# Altium schematic symbol library Regulator_Linear.SchLib: 1452 symbols (part 3 of 10) (continued)
## LD1086DT50TR
designator *  value LD1086DT50TR
ki_keywords: Linear Regulator 1.5A Fixed Output; ki_description: Positive, 1.5A 30V, Linear Regulator, Fixed Output 5V, TO-252; ki_fp_filters: TO?252?2*; Footprint: Package_TO_SOT_SMD:TO-252-2; Supplier: https://www.st.com/resource/en/datasheet/ld1086.pdf
footprint TO-252-2
pins: 1 ADJ/GND (in), 2 OUT (power), 3 IN (power)

## LD1086DTTR
designator *  value LD1086DTTR
ki_keywords: Linear Regulator 1.5A Adjustable; ki_description: Positive, 1.5A 30V, Linear Regulator, Adjustable, TO-252; ki_fp_filters: TO?252?2*; Footprint: Package_TO_SOT_SMD:TO-252-2; Supplier: https://www.st.com/resource/en/datasheet/ld1086.pdf
footprint TO-252-2
pins: 1 ADJ/GND (in), 2 OUT (power), 3 IN (power)

## LD1086PUR
designator *  value LD1086PUR
ki_keywords: Linear Regulator 1.5A Adjustable; ki_description: Positive, 1.5A 30V, Linear Regulator, Adjustable, DFN8; ki_fp_filters: DFN*1EP*4x4mm*P0.8mm*; Footprint: Package_DFN_QFN:DFN-8-1EP_4x4mm_P0.8mm_EP2.3x3.24mm; Supplier: https://www.st.com/resource/en/datasheet/ld1086.pdf
footprint DFN-8-1EP_4x4mm_P0.8mm_EP2.3x3.24mm
pins: 3 ADJ/GND (in), 7 IN (power), 8 IN hidden, 9 OUT (power)

## LD1086V18-DG
designator *  value LD1086V18-DG
ki_keywords: Linear Regulator 1.5A Fixed Output; ki_description: Positive, 1.5A 30V, Linear Regulator, Fixed Output 1.8V, TO-220; ki_fp_filters: TO?220*; Footprint: Package_TO_SOT_THT:TO-220-3_Vertical; Supplier: https://www.st.com/resource/en/datasheet/ld1086.pdf
footprint TO-220-3_Vertical
pins: 1 ADJ/GND (in), 2 OUT (power), 3 IN (power)

## LD1086V33-DG
designator *  value LD1086V33-DG
ki_keywords: Linear Regulator 1.5A Fixed Output; ki_description: Positive, 1.5A 30V, Linear Regulator, Fixed Output 3.3V, TO-220; ki_fp_filters: TO?220*; Footprint: Package_TO_SOT_THT:TO-220-3_Vertical; Supplier: https://www.st.com/resource/en/datasheet/ld1086.pdf
footprint TO-220-3_Vertical
pins: 1 ADJ/GND (in), 2 OUT (power), 3 IN (power)

## LD1086V-DG
designator *  value LD1086V-DG
ki_keywords: Linear Regulator 1.5A Adjustable; ki_description: Positive, 1.5A 30V, Linear Regulator, Adjustable, TO-220; ki_fp_filters: TO?220*; Footprint: Package_TO_SOT_THT:TO-220-3_Vertical; Supplier: https://www.st.com/resource/en/datasheet/ld1086.pdf
footprint TO-220-3_Vertical
pins: 1 ADJ/GND (in), 2 OUT (power), 3 IN (power)

## LD1117S12TR_SOT223
designator *  value LD1117S12TR_SOT223
ki_keywords: REGULATOR LDO 1.2V; ki_description: 800mA Fixed Low Drop Positive Voltage Regulator, Fixed Output 1.2V, SOT-223; ki_fp_filters: SOT?223*TabPin2*; Footprint: Package_TO_SOT_SMD:SOT-223-3_TabPin2; Supplier: http://www.st.com/st-web-ui/static/active/en/resource/technical/document/datasheet/CD00000544.pdf
footprint SOT-223-3_TabPin2
pins: 1 GND (power), 2 VO (power), 3 VI (power)

## LD1117S18TR_SOT223
designator *  value LD1117S18TR_SOT223
ki_keywords: REGULATOR LDO 1.8V; ki_description: 800mA Fixed Low Drop Positive Voltage Regulator, Fixed Output 1.8V, SOT-223; ki_fp_filters: SOT?223*TabPin2*; Footprint: Package_TO_SOT_SMD:SOT-223-3_TabPin2; Supplier: http://www.st.com/st-web-ui/static/active/en/resource/technical/document/datasheet/CD00000544.pdf
footprint SOT-223-3_TabPin2
pins: 1 GND (power), 2 VO (power), 3 VI (power)

## LD1117S25TR_SOT223
designator *  value LD1117S25TR_SOT223
ki_keywords: REGULATOR LDO 2.5V; ki_description: 800mA Fixed Low Drop Positive Voltage Regulator, Fixed Output 2.5V, SOT-223; ki_fp_filters: SOT?223*TabPin2*; Footprint: Package_TO_SOT_SMD:SOT-223-3_TabPin2; Supplier: http://www.st.com/st-web-ui/static/active/en/resource/technical/document/datasheet/CD00000544.pdf
footprint SOT-223-3_TabPin2
pins: 1 GND (power), 2 VO (power), 3 VI (power)

## LD1117S33TR_SOT223
designator *  value LD1117S33TR_SOT223
ki_keywords: REGULATOR LDO 3.3V; ki_description: 800mA Fixed Low Drop Positive Voltage Regulator, Fixed Output 3.3V, SOT-223; ki_fp_filters: SOT?223*TabPin2*; Footprint: Package_TO_SOT_SMD:SOT-223-3_TabPin2; Supplier: http://www.st.com/st-web-ui/static/active/en/resource/technical/document/datasheet/CD00000544.pdf
footprint SOT-223-3_TabPin2
pins: 1 GND (power), 2 VO (power), 3 VI (power)

## LD1117S50TR_SOT223
designator *  value LD1117S50TR_SOT223
ki_keywords: REGULATOR LDO 5.0V; ki_description: 800mA Fixed Low Drop Positive Voltage Regulator, Fixed Output 5.0V, SOT-223; ki_fp_filters: SOT?223*TabPin2*; Footprint: Package_TO_SOT_SMD:SOT-223-3_TabPin2; Supplier: http://www.st.com/st-web-ui/static/active/en/resource/technical/document/datasheet/CD00000544.pdf
footprint SOT-223-3_TabPin2
pins: 1 GND (power), 2 VO (power), 3 VI (power)

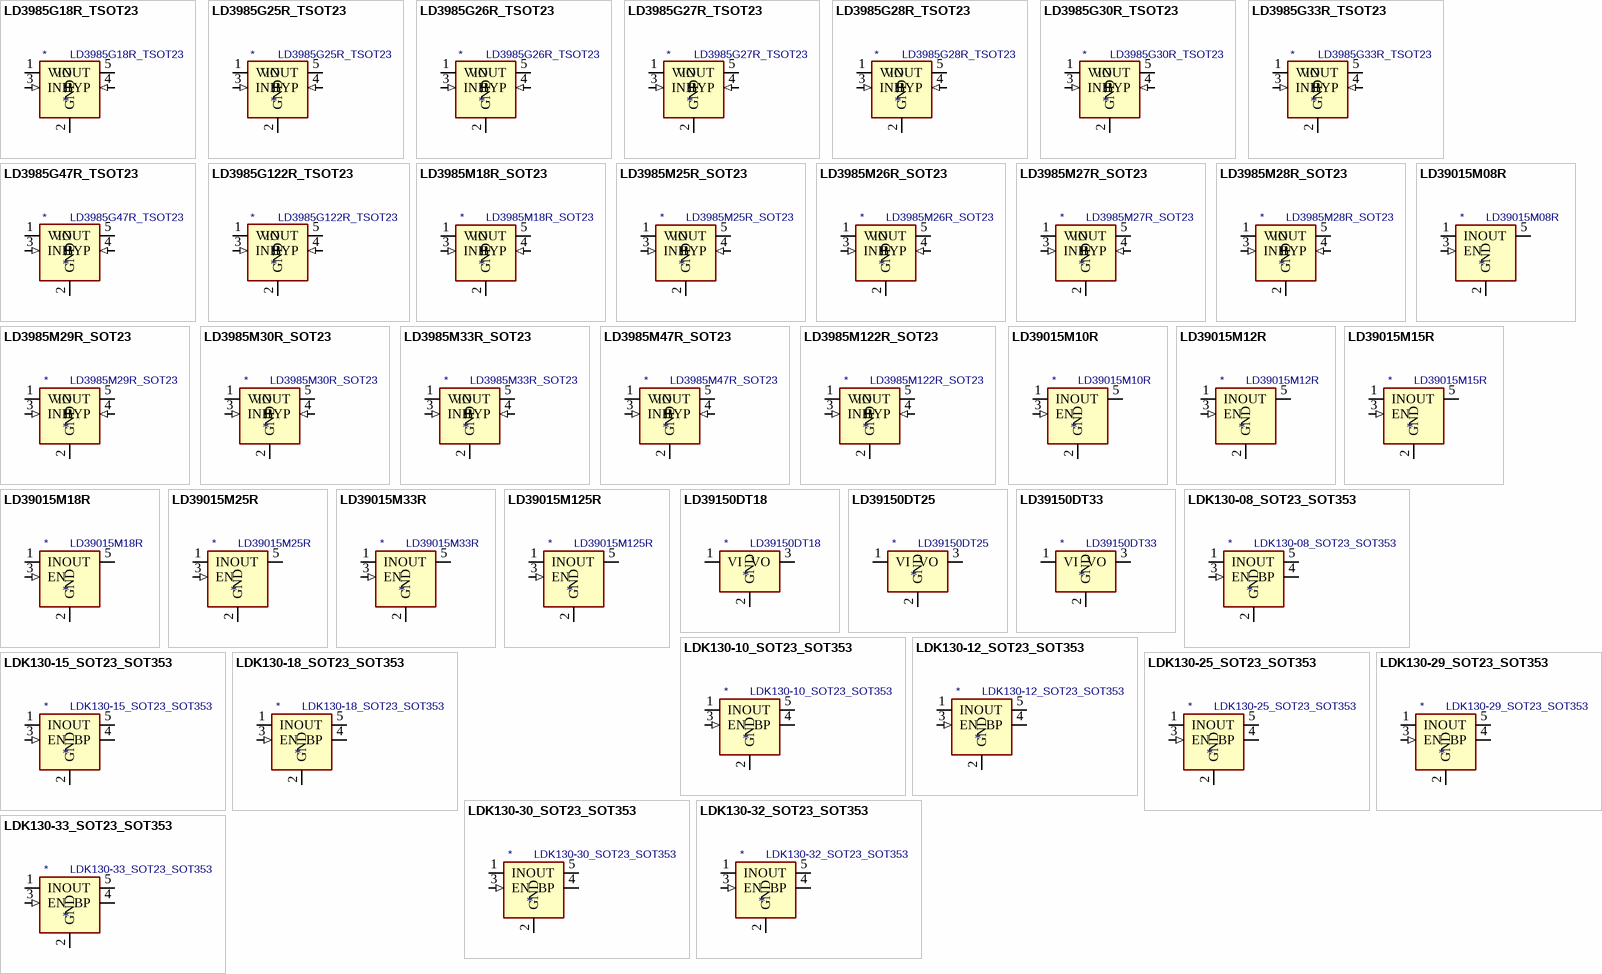
[diagram p10: symbols LD3985G18R_TSOT23 to LDK130-33_SOT23_SOT353]

## LD3985G18R_TSOT23
designator *  value LD3985G18R_TSOT23
ki_keywords: 150mA LDO Regulator Fixed Positive; ki_description: 150mA Low Dropout Voltage Regulator, Fixed Output 1.8V, TSOT-23-5; ki_fp_filters: TSOT?23*; Footprint: Package_TO_SOT_SMD:TSOT-23-5; Supplier: http://www.st.com/internet/com/TECHNICAL_RESOURCES/TECHNICAL_LITERATURE/DATASHEET/CD00003395.pdf
footprint TSOT-23-5
pins: 1 VIN (power), 2 GND (power), 3 INH (in), 4 BYP (in), 5 VOUT (power)

## LD3985G25R_TSOT23
designator *  value LD3985G25R_TSOT23
ki_keywords: 150mA LDO Regulator Fixed Positive; ki_description: 150mA Low Dropout Voltage Regulator, Fixed Output 2.5V, TSOT-23-5; ki_fp_filters: TSOT?23*; Footprint: Package_TO_SOT_SMD:TSOT-23-5; Supplier: http://www.st.com/internet/com/TECHNICAL_RESOURCES/TECHNICAL_LITERATURE/DATASHEET/CD00003395.pdf
footprint TSOT-23-5
pins: 1 VIN (power), 2 GND (power), 3 INH (in), 4 BYP (in), 5 VOUT (power)

## LD3985G26R_TSOT23
designator *  value LD3985G26R_TSOT23
ki_keywords: 150mA LDO Regulator Fixed Positive; ki_description: 150mA Low Dropout Voltage Regulator, Fixed Output 2.6V, TSOT-23-5; ki_fp_filters: TSOT?23*; Footprint: Package_TO_SOT_SMD:TSOT-23-5; Supplier: http://www.st.com/internet/com/TECHNICAL_RESOURCES/TECHNICAL_LITERATURE/DATASHEET/CD00003395.pdf
footprint TSOT-23-5
pins: 1 VIN (power), 2 GND (power), 3 INH (in), 4 BYP (in), 5 VOUT (power)

## LD3985G27R_TSOT23
designator *  value LD3985G27R_TSOT23
ki_keywords: 150mA LDO Regulator Fixed Positive; ki_description: 150mA Low Dropout Voltage Regulator, Fixed Output 2.7V, TSOT-23-5; ki_fp_filters: TSOT?23*; Footprint: Package_TO_SOT_SMD:TSOT-23-5; Supplier: http://www.st.com/internet/com/TECHNICAL_RESOURCES/TECHNICAL_LITERATURE/DATASHEET/CD00003395.pdf
footprint TSOT-23-5
pins: 1 VIN (power), 2 GND (power), 3 INH (in), 4 BYP (in), 5 VOUT (power)

## LD3985G28R_TSOT23
designator *  value LD3985G28R_TSOT23
ki_keywords: 150mA LDO Regulator Fixed Positive; ki_description: 150mA Low Dropout Voltage Regulator, Fixed Output 2.8V, TSOT-23-5; ki_fp_filters: TSOT?23*; Footprint: Package_TO_SOT_SMD:TSOT-23-5; Supplier: http://www.st.com/internet/com/TECHNICAL_RESOURCES/TECHNICAL_LITERATURE/DATASHEET/CD00003395.pdf
footprint TSOT-23-5
pins: 1 VIN (power), 2 GND (power), 3 INH (in), 4 BYP (in), 5 VOUT (power)

## LD3985G30R_TSOT23
designator *  value LD3985G30R_TSOT23
ki_keywords: 150mA LDO Regulator Fixed Positive; ki_description: 150mA Low Dropout Voltage Regulator, Fixed Output 3.0V, TSOT-23-5; ki_fp_filters: TSOT?23*; Footprint: Package_TO_SOT_SMD:TSOT-23-5; Supplier: http://www.st.com/internet/com/TECHNICAL_RESOURCES/TECHNICAL_LITERATURE/DATASHEET/CD00003395.pdf
footprint TSOT-23-5
pins: 1 VIN (power), 2 GND (power), 3 INH (in), 4 BYP (in), 5 VOUT (power)

## LD3985G33R_TSOT23
designator *  value LD3985G33R_TSOT23
ki_keywords: 150mA LDO Regulator Fixed Positive; ki_description: 150mA Low Dropout Voltage Regulator, Fixed Output 3.3V, TSOT-23-5; ki_fp_filters: TSOT?23*; Footprint: Package_TO_SOT_SMD:TSOT-23-5; Supplier: http://www.st.com/internet/com/TECHNICAL_RESOURCES/TECHNICAL_LITERATURE/DATASHEET/CD00003395.pdf
footprint TSOT-23-5
pins: 1 VIN (power), 2 GND (power), 3 INH (in), 4 BYP (in), 5 VOUT (power)

## LD3985G47R_TSOT23
designator *  value LD3985G47R_TSOT23
ki_keywords: 150mA LDO Regulator Fixed Positive; ki_description: 150mA Low Dropout Voltage Regulator, Fixed Output 4.7V, TSOT-23-5; ki_fp_filters: TSOT?23*; Footprint: Package_TO_SOT_SMD:TSOT-23-5; Supplier: http://www.st.com/internet/com/TECHNICAL_RESOURCES/TECHNICAL_LITERATURE/DATASHEET/CD00003395.pdf
footprint TSOT-23-5
pins: 1 VIN (power), 2 GND (power), 3 INH (in), 4 BYP (in), 5 VOUT (power)

## LD3985G122R_TSOT23
designator *  value LD3985G122R_TSOT23
ki_keywords: 150mA LDO Regulator Fixed Positive; ki_description: 150mA Low Dropout Voltage Regulator, Fixed Output 1.22V, TSOT-23-5; ki_fp_filters: TSOT?23*; Footprint: Package_TO_SOT_SMD:TSOT-23-5; Supplier: http://www.st.com/internet/com/TECHNICAL_RESOURCES/TECHNICAL_LITERATURE/DATASHEET/CD00003395.pdf
footprint TSOT-23-5
pins: 1 VIN (power), 2 GND (power), 3 INH (in), 4 BYP (in), 5 VOUT (power)

## LD3985M18R_SOT23
designator *  value LD3985M18R_SOT23
ki_keywords: 150mA LDO Regulator Fixed Positive; ki_description: 150mA Low Dropout Voltage Regulator, Fixed Output 1.8V, SOT-23-5; ki_fp_filters: SOT?23*; Footprint: Package_TO_SOT_SMD:SOT-23-5; Supplier: http://www.st.com/internet/com/TECHNICAL_RESOURCES/TECHNICAL_LITERATURE/DATASHEET/CD00003395.pdf
footprint SOT-23-5
pins: 1 VIN (power), 2 GND (power), 3 INH (in), 4 BYP (in), 5 VOUT (power)

## LD3985M25R_SOT23
designator *  value LD3985M25R_SOT23
ki_keywords: 150mA LDO Regulator Fixed Positive; ki_description: 150mA Low Dropout Voltage Regulator, Fixed Output 2.5V, SOT-23-5; ki_fp_filters: SOT?23*; Footprint: Package_TO_SOT_SMD:SOT-23-5; Supplier: http://www.st.com/internet/com/TECHNICAL_RESOURCES/TECHNICAL_LITERATURE/DATASHEET/CD00003395.pdf
footprint SOT-23-5
pins: 1 VIN (power), 2 GND (power), 3 INH (in), 4 BYP (in), 5 VOUT (power)

## LD3985M26R_SOT23
designator *  value LD3985M26R_SOT23
ki_keywords: 150mA LDO Regulator Fixed Positive; ki_description: 150mA Low Dropout Voltage Regulator, Fixed Output 2.6V, SOT-23-5; ki_fp_filters: SOT?23*; Footprint: Package_TO_SOT_SMD:SOT-23-5; Supplier: http://www.st.com/internet/com/TECHNICAL_RESOURCES/TECHNICAL_LITERATURE/DATASHEET/CD00003395.pdf
footprint SOT-23-5
pins: 1 VIN (power), 2 GND (power), 3 INH (in), 4 BYP (in), 5 VOUT (power)

## LD3985M27R_SOT23
designator *  value LD3985M27R_SOT23
ki_keywords: 150mA LDO Regulator Fixed Positive; ki_description: 150mA Low Dropout Voltage Regulator, Fixed Output 2.7V, SOT-23-5; ki_fp_filters: SOT?23*; Footprint: Package_TO_SOT_SMD:SOT-23-5; Supplier: http://www.st.com/internet/com/TECHNICAL_RESOURCES/TECHNICAL_LITERATURE/DATASHEET/CD00003395.pdf
footprint SOT-23-5
pins: 1 VIN (power), 2 GND (power), 3 INH (in), 4 BYP (in), 5 VOUT (power)

## LD3985M28R_SOT23
designator *  value LD3985M28R_SOT23
ki_keywords: 150mA LDO Regulator Fixed Positive; ki_description: 150mA Low Dropout Voltage Regulator, Fixed Output 2.8V, SOT-23-5; ki_fp_filters: SOT?23*; Footprint: Package_TO_SOT_SMD:SOT-23-5; Supplier: http://www.st.com/internet/com/TECHNICAL_RESOURCES/TECHNICAL_LITERATURE/DATASHEET/CD00003395.pdf
footprint SOT-23-5
pins: 1 VIN (power), 2 GND (power), 3 INH (in), 4 BYP (in), 5 VOUT (power)

## LD3985M29R_SOT23
designator *  value LD3985M29R_SOT23
ki_keywords: 150mA LDO Regulator Fixed Positive; ki_description: 150mA Low Dropout Voltage Regulator, Fixed Output 2.8V, SOT-23-5; ki_fp_filters: SOT?23*; Footprint: Package_TO_SOT_SMD:SOT-23-5; Supplier: http://www.st.com/internet/com/TECHNICAL_RESOURCES/TECHNICAL_LITERATURE/DATASHEET/CD00003395.pdf
footprint SOT-23-5
pins: 1 VIN (power), 2 GND (power), 3 INH (in), 4 BYP (in), 5 VOUT (power)

## LD3985M30R_SOT23
designator *  value LD3985M30R_SOT23
ki_keywords: 150mA LDO Regulator Fixed Positive; ki_description: 150mA Low Dropout Voltage Regulator, Fixed Output 3.0V, SOT-23-5; ki_fp_filters: SOT?23*; Footprint: Package_TO_SOT_SMD:SOT-23-5; Supplier: http://www.st.com/internet/com/TECHNICAL_RESOURCES/TECHNICAL_LITERATURE/DATASHEET/CD00003395.pdf
footprint SOT-23-5
pins: 1 VIN (power), 2 GND (power), 3 INH (in), 4 BYP (in), 5 VOUT (power)

## LD3985M33R_SOT23
designator *  value LD3985M33R_SOT23
ki_keywords: 150mA LDO Regulator Fixed Positive; ki_description: 150mA Low Dropout Voltage Regulator, Fixed Output 3.3V, SOT-23-5; ki_fp_filters: SOT?23*; Footprint: Package_TO_SOT_SMD:SOT-23-5; Supplier: http://www.st.com/internet/com/TECHNICAL_RESOURCES/TECHNICAL_LITERATURE/DATASHEET/CD00003395.pdf
footprint SOT-23-5
pins: 1 VIN (power), 2 GND (power), 3 INH (in), 4 BYP (in), 5 VOUT (power)

## LD3985M47R_SOT23
designator *  value LD3985M47R_SOT23
ki_keywords: 150mA LDO Regulator Fixed Positive; ki_description: 150mA Low Dropout Voltage Regulator, Fixed Output 4.7V, SOT-23-5; ki_fp_filters: SOT?23*; Footprint: Package_TO_SOT_SMD:SOT-23-5; Supplier: http://www.st.com/internet/com/TECHNICAL_RESOURCES/TECHNICAL_LITERATURE/DATASHEET/CD00003395.pdf
footprint SOT-23-5
pins: 1 VIN (power), 2 GND (power), 3 INH (in), 4 BYP (in), 5 VOUT (power)

## LD3985M122R_SOT23
designator *  value LD3985M122R_SOT23
ki_keywords: 150mA LDO Regulator Fixed Positive; ki_description: 150mA Low Dropout Voltage Regulator, Fixed Output 1.22V, SOT-23-5; ki_fp_filters: SOT?23*; Footprint: Package_TO_SOT_SMD:SOT-23-5; Supplier: http://www.st.com/internet/com/TECHNICAL_RESOURCES/TECHNICAL_LITERATURE/DATASHEET/CD00003395.pdf
footprint SOT-23-5
pins: 1 VIN (power), 2 GND (power), 3 INH (in), 4 BYP (in), 5 VOUT (power)

## LD39015M08R
designator *  value LD39015M08R
ki_keywords: 150mA LDO Regulator Fixed Positive; ki_description: 150mA low quiescent current low noise voltage regulator, Fixed Output 0.8V, SOT-23-5; ki_fp_filters: SOT?23*; Footprint: Package_TO_SOT_SMD:SOT-23-5; Supplier: http://www.st.com/resource/en/datasheet/ld39015.pdf
footprint SOT-23-5
pins: 1 IN (power), 2 GND (power), 3 EN (in), 4 NC (in) hidden, 5 OUT (power)

## LD39015M10R
designator *  value LD39015M10R
ki_keywords: 150mA LDO Regulator Fixed Positive; ki_description: 150mA low quiescent current low noise voltage regulator, Fixed Output 1.0V, SOT-23-5; ki_fp_filters: SOT?23*; Footprint: Package_TO_SOT_SMD:SOT-23-5; Supplier: http://www.st.com/resource/en/datasheet/ld39015.pdf
footprint SOT-23-5
pins: 1 IN (power), 2 GND (power), 3 EN (in), 4 NC (in) hidden, 5 OUT (power)

## LD39015M12R
designator *  value LD39015M12R
ki_keywords: 150mA LDO Regulator Fixed Positive; ki_description: 150mA low quiescent current low noise voltage regulator, Fixed Output 1.2V, SOT-23-5; ki_fp_filters: SOT?23*; Footprint: Package_TO_SOT_SMD:SOT-23-5; Supplier: http://www.st.com/resource/en/datasheet/ld39015.pdf
footprint SOT-23-5
pins: 1 IN (power), 2 GND (power), 3 EN (in), 4 NC (in) hidden, 5 OUT (power)

## LD39015M15R
designator *  value LD39015M15R
ki_keywords: 150mA LDO Regulator Fixed Positive; ki_description: 150mA low quiescent current low noise voltage regulator, Fixed Output 1.5V, SOT-23-5; ki_fp_filters: SOT?23*; Footprint: Package_TO_SOT_SMD:SOT-23-5; Supplier: http://www.st.com/resource/en/datasheet/ld39015.pdf
footprint SOT-23-5
pins: 1 IN (power), 2 GND (power), 3 EN (in), 4 NC (in) hidden, 5 OUT (power)

## LD39015M18R
designator *  value LD39015M18R
ki_keywords: 150mA LDO Regulator Fixed Positive; ki_description: 150mA low quiescent current low noise voltage regulator, Fixed Output 1.8V, SOT-23-5; ki_fp_filters: SOT?23*; Footprint: Package_TO_SOT_SMD:SOT-23-5; Supplier: http://www.st.com/resource/en/datasheet/ld39015.pdf
footprint SOT-23-5
pins: 1 IN (power), 2 GND (power), 3 EN (in), 4 NC (in) hidden, 5 OUT (power)

## LD39015M25R
designator *  value LD39015M25R
ki_keywords: 150mA LDO Regulator Fixed Positive; ki_description: 150mA low quiescent current low noise voltage regulator, Fixed Output 2.5V, SOT-23-5; ki_fp_filters: SOT?23*; Footprint: Package_TO_SOT_SMD:SOT-23-5; Supplier: http://www.st.com/resource/en/datasheet/ld39015.pdf
footprint SOT-23-5
pins: 1 IN (power), 2 GND (power), 3 EN (in), 4 NC (in) hidden, 5 OUT (power)

## LD39015M33R
designator *  value LD39015M33R
ki_keywords: 150mA LDO Regulator Fixed Positive; ki_description: 150mA low quiescent current low noise voltage regulator, Fixed Output 3.3V, SOT-23-5; ki_fp_filters: SOT?23*; Footprint: Package_TO_SOT_SMD:SOT-23-5; Supplier: http://www.st.com/resource/en/datasheet/ld39015.pdf
footprint SOT-23-5
pins: 1 IN (power), 2 GND (power), 3 EN (in), 4 NC (in) hidden, 5 OUT (power)

## LD39015M125R
designator *  value LD39015M125R
ki_keywords: 150mA LDO Regulator Fixed Positive; ki_description: 150mA low quiescent current low noise voltage regulator, Fixed Output 1.25V, SOT-23-5; ki_fp_filters: SOT?23*; Footprint: Package_TO_SOT_SMD:SOT-23-5; Supplier: http://www.st.com/resource/en/datasheet/ld39015.pdf
footprint SOT-23-5
pins: 1 IN (power), 2 GND (power), 3 EN (in), 4 NC (in) hidden, 5 OUT (power)

## LD39150DT18
designator *  value LD39150DT18
ki_keywords: linear regulator ldo fixed positive; ki_description: 1.5A Ultra Low Dropout regulator, positive, 1.8V fixed output, TO-252; ki_fp_filters: TO?252*TabPin2*; Footprint: Package_TO_SOT_SMD:TO-252-3_TabPin2; Supplier: https://www.st.com/resource/en/datasheet/ld39150.pdf
footprint TO-252-3_TabPin2
pins: 1 VI (power), 2 GND (power), 3 VO (power)

## LD39150DT25
designator *  value LD39150DT25
ki_keywords: linear regulator ldo fixed positive; ki_description: 1.5A Ultra Low Dropout regulator, positive, 2.5V fixed output, TO-252; ki_fp_filters: TO?252*TabPin2*; Footprint: Package_TO_SOT_SMD:TO-252-3_TabPin2; Supplier: https://www.st.com/resource/en/datasheet/ld39150.pdf
footprint TO-252-3_TabPin2
pins: 1 VI (power), 2 GND (power), 3 VO (power)

## LD39150DT33
designator *  value LD39150DT33
ki_keywords: linear regulator ldo fixed positive; ki_description: 1.5A Ultra Low Dropout regulator, positive, 3.3V fixed output, TO-252; ki_fp_filters: TO?252*TabPin2*; Footprint: Package_TO_SOT_SMD:TO-252-3_TabPin2; Supplier: https://www.st.com/resource/en/datasheet/ld39150.pdf
footprint TO-252-3_TabPin2
pins: 1 VI (power), 2 GND (power), 3 VO (power)

## LDK130-08_SOT23_SOT353
designator *  value LDK130-08_SOT23_SOT353
ki_keywords: linear regulator ldo fixed positive low noise low quienscent current; ki_description: 300mA low dropout linear regulator, low quiescent current very, low noise, shutdown pin, 0.8V fixed positive output, SOT-23-5/SOT-353-5/SC-70-5; ki_fp_filters: SOT?23* SOT?353* *SC?70*; Supplier: http://www.st.com/content/ccc/resource/technical/document/datasheet/29/10/f7/87/2f/66/47/f4/DM00076097.pdf/files/DM00076097.pdf/jcr:content/translations/en.DM00076097.pdf
pins: 1 IN (power), 2 GND (power), 3 EN (in), 4 BP, 5 OUT (power)

## LDK130-10_SOT23_SOT353
designator *  value LDK130-10_SOT23_SOT353
ki_keywords: linear regulator ldo fixed positive low noise low quienscent current; ki_description: 300mA low dropout linear regulator, low quiescent current very, low noise, shutdown pin, 1.0V fixed positive output, SOT-23-5/SOT-353-5/SC-70-5; ki_fp_filters: SOT?23* SOT?353* *SC?70*; Supplier: http://www.st.com/content/ccc/resource/technical/document/datasheet/29/10/f7/87/2f/66/47/f4/DM00076097.pdf/files/DM00076097.pdf/jcr:content/translations/en.DM00076097.pdf
pins: 1 IN (power), 2 GND (power), 3 EN (in), 4 BP, 5 OUT (power)

## LDK130-12_SOT23_SOT353
designator *  value LDK130-12_SOT23_SOT353
ki_keywords: linear regulator ldo fixed positive low noise low quienscent current; ki_description: 300mA low dropout linear regulator, low quiescent current very, low noise, shutdown pin, 1.2V fixed positive output, SOT-23-5/SOT-353-5/SC-70-5; ki_fp_filters: SOT?23* SOT?353* *SC?70*; Supplier: http://www.st.com/content/ccc/resource/technical/document/datasheet/29/10/f7/87/2f/66/47/f4/DM00076097.pdf/files/DM00076097.pdf/jcr:content/translations/en.DM00076097.pdf
pins: 1 IN (power), 2 GND (power), 3 EN (in), 4 BP, 5 OUT (power)

## LDK130-15_SOT23_SOT353
designator *  value LDK130-15_SOT23_SOT353
ki_keywords: linear regulator ldo fixed positive low noise low quienscent current; ki_description: 300mA low dropout linear regulator, low quiescent current very, low noise, shutdown pin, 1.5V fixed positive output, SOT-23-5/SOT-353-5/SC-70-5; ki_fp_filters: SOT?23* SOT?353* *SC?70*; Supplier: http://www.st.com/content/ccc/resource/technical/document/datasheet/29/10/f7/87/2f/66/47/f4/DM00076097.pdf/files/DM00076097.pdf/jcr:content/translations/en.DM00076097.pdf
pins: 1 IN (power), 2 GND (power), 3 EN (in), 4 BP, 5 OUT (power)

## LDK130-18_SOT23_SOT353
designator *  value LDK130-18_SOT23_SOT353
ki_keywords: linear regulator ldo fixed positive low noise low quienscent current; ki_description: 300mA low dropout linear regulator, low quiescent current very, low noise, shutdown pin, 1.8V fixed positive output, SOT-23-5/SOT-353-5/SC-70-5; ki_fp_filters: SOT?23* SOT?353* *SC?70*; Supplier: http://www.st.com/content/ccc/resource/technical/document/datasheet/29/10/f7/87/2f/66/47/f4/DM00076097.pdf/files/DM00076097.pdf/jcr:content/translations/en.DM00076097.pdf
pins: 1 IN (power), 2 GND (power), 3 EN (in), 4 BP, 5 OUT (power)

## LDK130-25_SOT23_SOT353
designator *  value LDK130-25_SOT23_SOT353
ki_keywords: linear regulator ldo fixed positive low noise low quienscent current; ki_description: 300mA low dropout linear regulator, low quiescent current very, low noise, shutdown pin, 2.5V fixed positive output, SOT-23-5/SOT-353-5/SC-70-5; ki_fp_filters: SOT?23* SOT?353* *SC?70*; Supplier: http://www.st.com/content/ccc/resource/technical/document/datasheet/29/10/f7/87/2f/66/47/f4/DM00076097.pdf/files/DM00076097.pdf/jcr:content/translations/en.DM00076097.pdf
pins: 1 IN (power), 2 GND (power), 3 EN (in), 4 BP, 5 OUT (power)

## LDK130-29_SOT23_SOT353
designator *  value LDK130-29_SOT23_SOT353
ki_keywords: linear regulator ldo fixed positive low noise low quienscent current; ki_description: 300mA low dropout linear regulator, low quiescent current very, low noise, shutdown pin, 2.9V fixed positive output, SOT-23-5/SOT-353-5/SC-70-5; ki_fp_filters: SOT?23* SOT?353* *SC?70*; Supplier: http://www.st.com/content/ccc/resource/technical/document/datasheet/29/10/f7/87/2f/66/47/f4/DM00076097.pdf/files/DM00076097.pdf/jcr:content/translations/en.DM00076097.pdf
pins: 1 IN (power), 2 GND (power), 3 EN (in), 4 BP, 5 OUT (power)

## LDK130-30_SOT23_SOT353
designator *  value LDK130-30_SOT23_SOT353
ki_keywords: linear regulator ldo fixed positive low noise low quienscent current; ki_description: 300mA low dropout linear regulator, low quiescent current very, low noise, shutdown pin, 3.0V fixed positive output, SOT-23-5/SOT-353-5/SC-70-5; ki_fp_filters: SOT?23* SOT?353* *SC?70*; Supplier: http://www.st.com/content/ccc/resource/technical/document/datasheet/29/10/f7/87/2f/66/47/f4/DM00076097.pdf/files/DM00076097.pdf/jcr:content/translations/en.DM00076097.pdf
pins: 1 IN (power), 2 GND (power), 3 EN (in), 4 BP, 5 OUT (power)

## LDK130-32_SOT23_SOT353
designator *  value LDK130-32_SOT23_SOT353
ki_keywords: linear regulator ldo fixed positive low noise low quienscent current; ki_description: 300mA low dropout linear regulator, low quiescent current very, low noise, shutdown pin, 3.2V fixed positive output, SOT-23-5/SOT-353-5/SC-70-5; ki_fp_filters: SOT?23* SOT?353* *SC?70*; Supplier: http://www.st.com/content/ccc/resource/technical/document/datasheet/29/10/f7/87/2f/66/47/f4/DM00076097.pdf/files/DM00076097.pdf/jcr:content/translations/en.DM00076097.pdf
pins: 1 IN (power), 2 GND (power), 3 EN (in), 4 BP, 5 OUT (power)

## LDK130-33_SOT23_SOT353
designator *  value LDK130-33_SOT23_SOT353
ki_keywords: linear regulator ldo fixed positive low noise low quienscent current; ki_description: 300mA low dropout linear regulator, low quiescent current very, low noise, shutdown pin, 3.3V fixed positive output, SOT-23-5/SOT-353-5/SC-70-5; ki_fp_filters: SOT?23* SOT?353* *SC?70*; Supplier: http://www.st.com/content/ccc/resource/technical/document/datasheet/29/10/f7/87/2f/66/47/f4/DM00076097.pdf/files/DM00076097.pdf/jcr:content/translations/en.DM00076097.pdf
pins: 1 IN (power), 2 GND (power), 3 EN (in), 4 BP, 5 OUT (power)

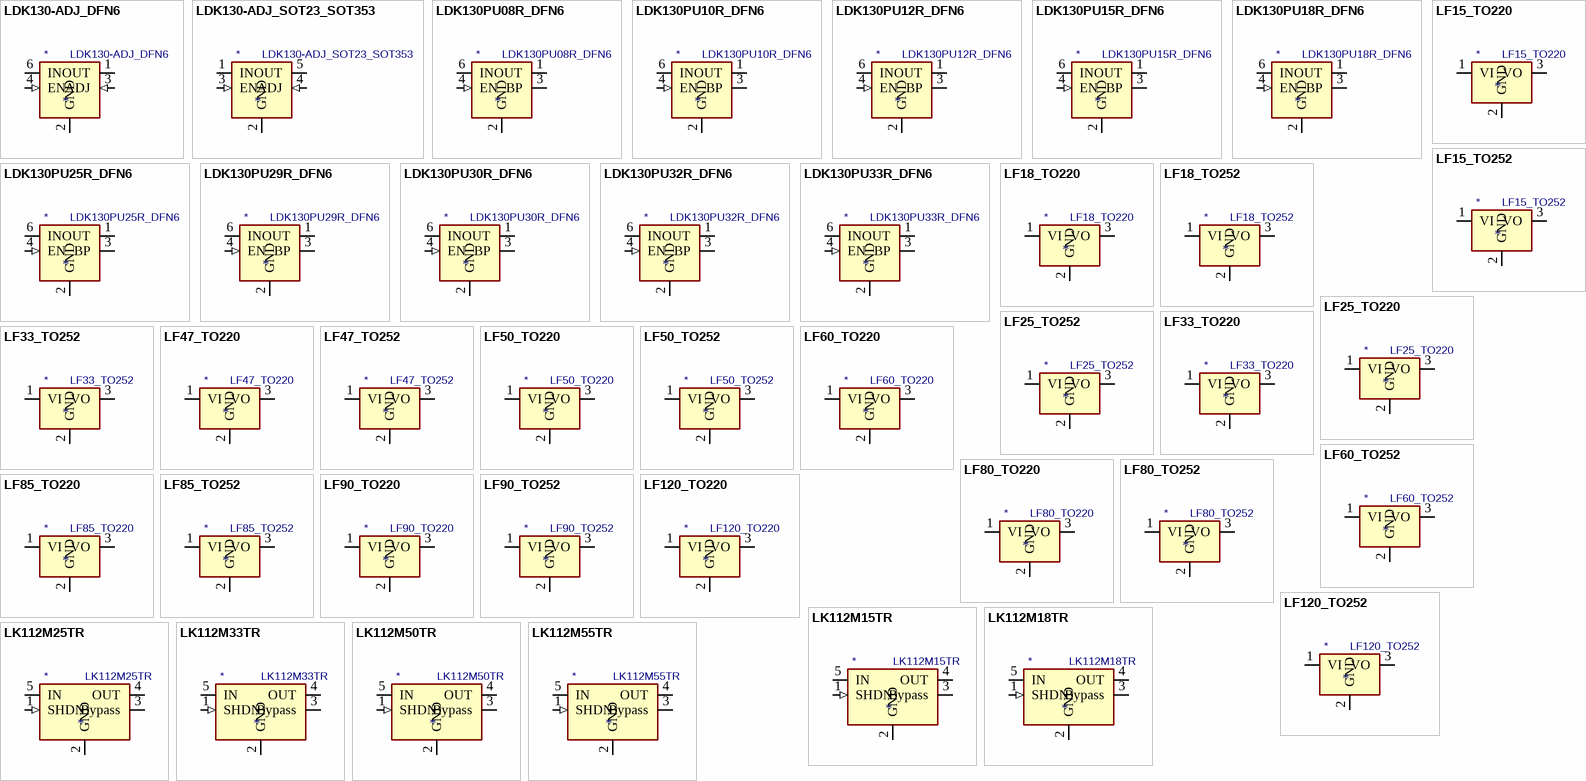
[diagram p11: symbols LDK130-ADJ_DFN6 to LK112M55TR]

## LDK130-ADJ_DFN6
designator *  value LDK130-ADJ_DFN6
ki_keywords: linear regulator ldo adjustable positive low noise low quienscent current; ki_description: 300mA low dropout linear regulator, low quiescent current very, low noise, shutdown pin, adjustable positive output, DFN-6; ki_fp_filters: DFN*1.3x1.2mm*P0.4mm*; Footprint: Package_DFN_QFN:DFN-6_1.3x1.2mm_P0.4mm; Supplier: http://www.st.com/content/ccc/resource/technical/document/datasheet/29/10/f7/87/2f/66/47/f4/DM00076097.pdf/files/DM00076097.pdf/jcr:content/translations/en.DM00076097.pdf
footprint DFN-6_1.3x1.2mm_P0.4mm
pins: 1 OUT (power), 2 GND (power), 3 ADJ (in), 4 EN (in), 5 NC (in) hidden, 6 IN (power)

## LDK130-ADJ_SOT23_SOT353
designator *  value LDK130-ADJ_SOT23_SOT353
ki_keywords: linear regulator ldo adjustable positive low noise low quienscent current; ki_description: 300mA low dropout linear regulator, low quiescent current very, low noise, shutdown pin, adjustable positive output, SOT-23-5/SOT-353-5/SC-70-5; ki_fp_filters: SOT?23* SOT?353* *SC?70*; Supplier: http://www.st.com/content/ccc/resource/technical/document/datasheet/29/10/f7/87/2f/66/47/f4/DM00076097.pdf/files/DM00076097.pdf/jcr:content/translations/en.DM00076097.pdf
pins: 1 IN (power), 2 GND (power), 3 EN (in), 4 ADJ (in), 5 OUT (power)

## LDK130PU08R_DFN6
designator *  value LDK130PU08R_DFN6
ki_keywords: linear regulator ldo fixed positive low noise low quienscent current; ki_description: 300mA low dropout linear regulator, low quiescent current very, low noise, shutdown pin, fixed 0.8V positive output, DFN-6; ki_fp_filters: DFN*1.3x1.2mm*P0.4mm*; Footprint: Package_DFN_QFN:DFN-6_1.3x1.2mm_P0.4mm; Supplier: http://www.st.com/content/ccc/resource/technical/document/datasheet/29/10/f7/87/2f/66/47/f4/DM00076097.pdf/files/DM00076097.pdf/jcr:content/translations/en.DM00076097.pdf
footprint DFN-6_1.3x1.2mm_P0.4mm
pins: 1 OUT (power), 2 GND (power), 3 BP, 4 EN (in), 5 NC (in) hidden, 6 IN (power)

## LDK130PU10R_DFN6
designator *  value LDK130PU10R_DFN6
ki_keywords: linear regulator ldo fixed positive low noise low quienscent current; ki_description: 300mA low dropout linear regulator, low quiescent current very, low noise, shutdown pin, fixed 1.0V positive output, DFN-6; ki_fp_filters: DFN*1.3x1.2mm*P0.4mm*; Footprint: Package_DFN_QFN:DFN-6_1.3x1.2mm_P0.4mm; Supplier: http://www.st.com/content/ccc/resource/technical/document/datasheet/29/10/f7/87/2f/66/47/f4/DM00076097.pdf/files/DM00076097.pdf/jcr:content/translations/en.DM00076097.pdf
footprint DFN-6_1.3x1.2mm_P0.4mm
pins: 1 OUT (power), 2 GND (power), 3 BP, 4 EN (in), 5 NC (in) hidden, 6 IN (power)

## LDK130PU12R_DFN6
designator *  value LDK130PU12R_DFN6
ki_keywords: linear regulator ldo fixed positive low noise low quienscent current; ki_description: 300mA low dropout linear regulator, low quiescent current very, low noise, shutdown pin, fixed 1.2V positive output, DFN-6; ki_fp_filters: DFN*1.3x1.2mm*P0.4mm*; Footprint: Package_DFN_QFN:DFN-6_1.3x1.2mm_P0.4mm; Supplier: http://www.st.com/content/ccc/resource/technical/document/datasheet/29/10/f7/87/2f/66/47/f4/DM00076097.pdf/files/DM00076097.pdf/jcr:content/translations/en.DM00076097.pdf
footprint DFN-6_1.3x1.2mm_P0.4mm
pins: 1 OUT (power), 2 GND (power), 3 BP, 4 EN (in), 5 NC (in) hidden, 6 IN (power)

## LDK130PU15R_DFN6
designator *  value LDK130PU15R_DFN6
ki_keywords: linear regulator ldo fixed positive low noise low quienscent current; ki_description: 300mA low dropout linear regulator, low quiescent current very, low noise, shutdown pin, fixed 1.5V positive output, DFN-6; ki_fp_filters: DFN*1.3x1.2mm*P0.4mm*; Footprint: Package_DFN_QFN:DFN-6_1.3x1.2mm_P0.4mm; Supplier: http://www.st.com/content/ccc/resource/technical/document/datasheet/29/10/f7/87/2f/66/47/f4/DM00076097.pdf/files/DM00076097.pdf/jcr:content/translations/en.DM00076097.pdf
footprint DFN-6_1.3x1.2mm_P0.4mm
pins: 1 OUT (power), 2 GND (power), 3 BP, 4 EN (in), 5 NC (in) hidden, 6 IN (power)

## LDK130PU18R_DFN6
designator *  value LDK130PU18R_DFN6
ki_keywords: linear regulator ldo fixed positive low noise low quienscent current; ki_description: 300mA low dropout linear regulator, low quiescent current very, low noise, shutdown pin, fixed 1.8V positive output, DFN-6; ki_fp_filters: DFN*1.3x1.2mm*P0.4mm*; Footprint: Package_DFN_QFN:DFN-6_1.3x1.2mm_P0.4mm; Supplier: http://www.st.com/content/ccc/resource/technical/document/datasheet/29/10/f7/87/2f/66/47/f4/DM00076097.pdf/files/DM00076097.pdf/jcr:content/translations/en.DM00076097.pdf
footprint DFN-6_1.3x1.2mm_P0.4mm
pins: 1 OUT (power), 2 GND (power), 3 BP, 4 EN (in), 5 NC (in) hidden, 6 IN (power)

## LDK130PU25R_DFN6
designator *  value LDK130PU25R_DFN6
ki_keywords: linear regulator ldo fixed positive low noise low quienscent current; ki_description: 300mA low dropout linear regulator, low quiescent current very, low noise, shutdown pin, fixed 2.5V positive output, DFN-6; ki_fp_filters: DFN*1.3x1.2mm*P0.4mm*; Footprint: Package_DFN_QFN:DFN-6_1.3x1.2mm_P0.4mm; Supplier: http://www.st.com/content/ccc/resource/technical/document/datasheet/29/10/f7/87/2f/66/47/f4/DM00076097.pdf/files/DM00076097.pdf/jcr:content/translations/en.DM00076097.pdf
footprint DFN-6_1.3x1.2mm_P0.4mm
pins: 1 OUT (power), 2 GND (power), 3 BP, 4 EN (in), 5 NC (in) hidden, 6 IN (power)

## LDK130PU29R_DFN6
designator *  value LDK130PU29R_DFN6
ki_keywords: linear regulator ldo fixed positive low noise low quienscent current; ki_description: 300mA low dropout linear regulator, low quiescent current very, low noise, shutdown pin, fixed 2.9V positive output, DFN-6; ki_fp_filters: DFN*1.3x1.2mm*P0.4mm*; Footprint: Package_DFN_QFN:DFN-6_1.3x1.2mm_P0.4mm; Supplier: http://www.st.com/content/ccc/resource/technical/document/datasheet/29/10/f7/87/2f/66/47/f4/DM00076097.pdf/files/DM00076097.pdf/jcr:content/translations/en.DM00076097.pdf
footprint DFN-6_1.3x1.2mm_P0.4mm
pins: 1 OUT (power), 2 GND (power), 3 BP, 4 EN (in), 5 NC (in) hidden, 6 IN (power)

## LDK130PU30R_DFN6
designator *  value LDK130PU30R_DFN6
ki_keywords: linear regulator ldo fixed positive low noise low quienscent current; ki_description: 300mA low dropout linear regulator, low quiescent current very, low noise, shutdown pin, fixed 3.0V positive output, DFN-6; ki_fp_filters: DFN*1.3x1.2mm*P0.4mm*; Footprint: Package_DFN_QFN:DFN-6_1.3x1.2mm_P0.4mm; Supplier: http://www.st.com/content/ccc/resource/technical/document/datasheet/29/10/f7/87/2f/66/47/f4/DM00076097.pdf/files/DM00076097.pdf/jcr:content/translations/en.DM00076097.pdf
footprint DFN-6_1.3x1.2mm_P0.4mm
pins: 1 OUT (power), 2 GND (power), 3 BP, 4 EN (in), 5 NC (in) hidden, 6 IN (power)

## LDK130PU32R_DFN6
designator *  value LDK130PU32R_DFN6
ki_keywords: linear regulator ldo fixed positive low noise low quienscent current; ki_description: 300mA low dropout linear regulator, low quiescent current very, low noise, shutdown pin, fixed 3.2V positive output, DFN-6; ki_fp_filters: DFN*1.3x1.2mm*P0.4mm*; Footprint: Package_DFN_QFN:DFN-6_1.3x1.2mm_P0.4mm; Supplier: http://www.st.com/content/ccc/resource/technical/document/datasheet/29/10/f7/87/2f/66/47/f4/DM00076097.pdf/files/DM00076097.pdf/jcr:content/translations/en.DM00076097.pdf
footprint DFN-6_1.3x1.2mm_P0.4mm
pins: 1 OUT (power), 2 GND (power), 3 BP, 4 EN (in), 5 NC (in) hidden, 6 IN (power)

## LDK130PU33R_DFN6
designator *  value LDK130PU33R_DFN6
ki_keywords: linear regulator ldo fixed positive low noise low quienscent current; ki_description: 300mA low dropout linear regulator, low quiescent current very, low noise, shutdown pin, fixed 3.3V positive output, DFN-6; ki_fp_filters: DFN*1.3x1.2mm*P0.4mm*; Footprint: Package_DFN_QFN:DFN-6_1.3x1.2mm_P0.4mm; Supplier: http://www.st.com/content/ccc/resource/technical/document/datasheet/29/10/f7/87/2f/66/47/f4/DM00076097.pdf/files/DM00076097.pdf/jcr:content/translations/en.DM00076097.pdf
footprint DFN-6_1.3x1.2mm_P0.4mm
pins: 1 OUT (power), 2 GND (power), 3 BP, 4 EN (in), 5 NC (in) hidden, 6 IN (power)

## LF15_TO220
designator *  value LF15_TO220
ki_keywords: LDO regulator voltage; ki_description: Low-drop Voltage Regulator, Io up to 500mA, Fixed Vo 1.5V, TO-220; ki_fp_filters: TO?220*; Footprint: Package_TO_SOT_THT:TO-220-3_Vertical; Supplier: http://www.st.com/content/ccc/resource/technical/document/datasheet/c4/0e/7e/2a/be/bc/4c/bd/CD00000546.pdf/files/CD00000546.pdf/jcr:content/translations/en.CD00000546.pdf
footprint TO-220-3_Vertical
pins: 1 VI (power), 2 GND (power), 3 VO (power)

## LF15_TO252
designator *  value LF15_TO252
ki_keywords: LDO regulator voltage; ki_description: Low-drop Voltage Regulator, Io up to 500mA, Fixed Vo 1.5V, TO-252 (DPAK); ki_fp_filters: TO?252*; Footprint: Package_TO_SOT_SMD:TO-252-2; Supplier: http://www.st.com/content/ccc/resource/technical/document/datasheet/c4/0e/7e/2a/be/bc/4c/bd/CD00000546.pdf/files/CD00000546.pdf/jcr:content/translations/en.CD00000546.pdf
footprint TO-252-2
pins: 1 VI (power), 2 GND (power), 3 VO (power)

## LF18_TO220
designator *  value LF18_TO220
ki_keywords: LDO regulator voltage; ki_description: Low-drop Voltage Regulator, Io up to 500mA, Fixed Vo 1.8V, TO-220; ki_fp_filters: TO?220*; Footprint: Package_TO_SOT_THT:TO-220-3_Vertical; Supplier: http://www.st.com/content/ccc/resource/technical/document/datasheet/c4/0e/7e/2a/be/bc/4c/bd/CD00000546.pdf/files/CD00000546.pdf/jcr:content/translations/en.CD00000546.pdf
footprint TO-220-3_Vertical
pins: 1 VI (power), 2 GND (power), 3 VO (power)

## LF18_TO252
designator *  value LF18_TO252
ki_keywords: LDO regulator voltage; ki_description: Low-drop Voltage Regulator, Io up to 500mA, Fixed Vo 1.8V, TO-252 (DPAK); ki_fp_filters: TO?252*; Footprint: Package_TO_SOT_SMD:TO-252-2; Supplier: http://www.st.com/content/ccc/resource/technical/document/datasheet/c4/0e/7e/2a/be/bc/4c/bd/CD00000546.pdf/files/CD00000546.pdf/jcr:content/translations/en.CD00000546.pdf
footprint TO-252-2
pins: 1 VI (power), 2 GND (power), 3 VO (power)

## LF25_TO220
designator *  value LF25_TO220
ki_keywords: LDO regulator voltage; ki_description: Low-drop Voltage Regulator, Io up to 500mA, Fixed Vo 2.5V, TO-220; ki_fp_filters: TO?220*; Footprint: Package_TO_SOT_THT:TO-220-3_Vertical; Supplier: http://www.st.com/content/ccc/resource/technical/document/datasheet/c4/0e/7e/2a/be/bc/4c/bd/CD00000546.pdf/files/CD00000546.pdf/jcr:content/translations/en.CD00000546.pdf
footprint TO-220-3_Vertical
pins: 1 VI (power), 2 GND (power), 3 VO (power)

## LF25_TO252
designator *  value LF25_TO252
ki_keywords: LDO regulator voltage; ki_description: Low-drop Voltage Regulator, Io up to 500mA, Fixed Vo 2.5V, TO-252 (DPAK); ki_fp_filters: TO?252*; Footprint: Package_TO_SOT_SMD:TO-252-2; Supplier: http://www.st.com/content/ccc/resource/technical/document/datasheet/c4/0e/7e/2a/be/bc/4c/bd/CD00000546.pdf/files/CD00000546.pdf/jcr:content/translations/en.CD00000546.pdf
footprint TO-252-2
pins: 1 VI (power), 2 GND (power), 3 VO (power)

## LF33_TO220
designator *  value LF33_TO220
ki_keywords: LDO regulator voltage; ki_description: Low-drop Voltage Regulator, Io up to 500mA, Fixed Vo 3.3V, TO-220; ki_fp_filters: TO?220*; Footprint: Package_TO_SOT_THT:TO-220-3_Vertical; Supplier: http://www.st.com/content/ccc/resource/technical/document/datasheet/c4/0e/7e/2a/be/bc/4c/bd/CD00000546.pdf/files/CD00000546.pdf/jcr:content/translations/en.CD00000546.pdf
footprint TO-220-3_Vertical
pins: 1 VI (power), 2 GND (power), 3 VO (power)

## LF33_TO252
designator *  value LF33_TO252
ki_keywords: LDO regulator voltage; ki_description: Low-drop Voltage Regulator, Io up to 500mA, Fixed Vo 3.3V, TO-252 (DPAK); ki_fp_filters: TO?252*; Footprint: Package_TO_SOT_SMD:TO-252-2; Supplier: http://www.st.com/content/ccc/resource/technical/document/datasheet/c4/0e/7e/2a/be/bc/4c/bd/CD00000546.pdf/files/CD00000546.pdf/jcr:content/translations/en.CD00000546.pdf
footprint TO-252-2
pins: 1 VI (power), 2 GND (power), 3 VO (power)

## LF47_TO220
designator *  value LF47_TO220
ki_keywords: LDO regulator voltage; ki_description: Low-drop Voltage Regulator, Io up to 500mA, Fixed Vo 4.7V, TO-220; ki_fp_filters: TO?220*; Footprint: Package_TO_SOT_THT:TO-220-3_Vertical; Supplier: http://www.st.com/content/ccc/resource/technical/document/datasheet/c4/0e/7e/2a/be/bc/4c/bd/CD00000546.pdf/files/CD00000546.pdf/jcr:content/translations/en.CD00000546.pdf
footprint TO-220-3_Vertical
pins: 1 VI (power), 2 GND (power), 3 VO (power)

## LF47_TO252
designator *  value LF47_TO252
ki_keywords: LDO regulator voltage; ki_description: Low-drop Voltage Regulator, Io up to 500mA, Fixed Vo 4.7V, TO-252 (DPAK); ki_fp_filters: TO?252*; Footprint: Package_TO_SOT_SMD:TO-252-2; Supplier: http://www.st.com/content/ccc/resource/technical/document/datasheet/c4/0e/7e/2a/be/bc/4c/bd/CD00000546.pdf/files/CD00000546.pdf/jcr:content/translations/en.CD00000546.pdf
footprint TO-252-2
pins: 1 VI (power), 2 GND (power), 3 VO (power)

## LF50_TO220
designator *  value LF50_TO220
ki_keywords: LDO regulator voltage; ki_description: Low-drop Voltage Regulator, Io up to 500mA, Fixed Vo 5.0V, TO-220; ki_fp_filters: TO?220*; Footprint: Package_TO_SOT_THT:TO-220-3_Vertical; Supplier: http://www.st.com/content/ccc/resource/technical/document/datasheet/c4/0e/7e/2a/be/bc/4c/bd/CD00000546.pdf/files/CD00000546.pdf/jcr:content/translations/en.CD00000546.pdf
footprint TO-220-3_Vertical
pins: 1 VI (power), 2 GND (power), 3 VO (power)

## LF50_TO252
designator *  value LF50_TO252
ki_keywords: LDO regulator voltage; ki_description: Low-drop Voltage Regulator, Io up to 500mA, Fixed Vo 5.0V, TO-252 (DPAK); ki_fp_filters: TO?252*; Footprint: Package_TO_SOT_SMD:TO-252-2; Supplier: http://www.st.com/content/ccc/resource/technical/document/datasheet/c4/0e/7e/2a/be/bc/4c/bd/CD00000546.pdf/files/CD00000546.pdf/jcr:content/translations/en.CD00000546.pdf
footprint TO-252-2
pins: 1 VI (power), 2 GND (power), 3 VO (power)

## LF60_TO220
designator *  value LF60_TO220
ki_keywords: LDO regulator voltage; ki_description: Low-drop Voltage Regulator, Io up to 500mA, Fixed Vo 6.0V, TO-220; ki_fp_filters: TO?220*; Footprint: Package_TO_SOT_THT:TO-220-3_Vertical; Supplier: http://www.st.com/content/ccc/resource/technical/document/datasheet/c4/0e/7e/2a/be/bc/4c/bd/CD00000546.pdf/files/CD00000546.pdf/jcr:content/translations/en.CD00000546.pdf
footprint TO-220-3_Vertical
pins: 1 VI (power), 2 GND (power), 3 VO (power)

## LF60_TO252
designator *  value LF60_TO252
ki_keywords: LDO regulator voltage; ki_description: Low-drop Voltage Regulator, Io up to 500mA, Fixed Vo 6.0V, TO-252 (DPAK); ki_fp_filters: TO?252*; Footprint: Package_TO_SOT_SMD:TO-252-2; Supplier: http://www.st.com/content/ccc/resource/technical/document/datasheet/c4/0e/7e/2a/be/bc/4c/bd/CD00000546.pdf/files/CD00000546.pdf/jcr:content/translations/en.CD00000546.pdf
footprint TO-252-2
pins: 1 VI (power), 2 GND (power), 3 VO (power)

## LF80_TO220
designator *  value LF80_TO220
ki_keywords: LDO regulator voltage; ki_description: Low-drop Voltage Regulator, Io up to 500mA, Fixed Vo 8.0V, TO-220; ki_fp_filters: TO?220*; Footprint: Package_TO_SOT_THT:TO-220-3_Vertical; Supplier: http://www.st.com/content/ccc/resource/technical/document/datasheet/c4/0e/7e/2a/be/bc/4c/bd/CD00000546.pdf/files/CD00000546.pdf/jcr:content/translations/en.CD00000546.pdf
footprint TO-220-3_Vertical
pins: 1 VI (power), 2 GND (power), 3 VO (power)

## LF80_TO252
designator *  value LF80_TO252
ki_keywords: LDO regulator voltage; ki_description: Low-drop Voltage Regulator, Io up to 500mA, Fixed Vo 8.0V, TO-252 (DPAK); ki_fp_filters: TO?252*; Footprint: Package_TO_SOT_SMD:TO-252-2; Supplier: http://www.st.com/content/ccc/resource/technical/document/datasheet/c4/0e/7e/2a/be/bc/4c/bd/CD00000546.pdf/files/CD00000546.pdf/jcr:content/translations/en.CD00000546.pdf
footprint TO-252-2
pins: 1 VI (power), 2 GND (power), 3 VO (power)